# Altium footprint library Package_DFN_QFN.PcbLib: 557 footprints (part 1 of 35)
Each footprint in its own frame and in the unit in brackets; x right, y up, seen from the top. Pads: shape width x height; smd on the part's side, far side on the other; paste and mask are expansions set on the pad; w line width, h text height; cw(c..) or ccw(c..) is an arc to the next point about the centre after c.
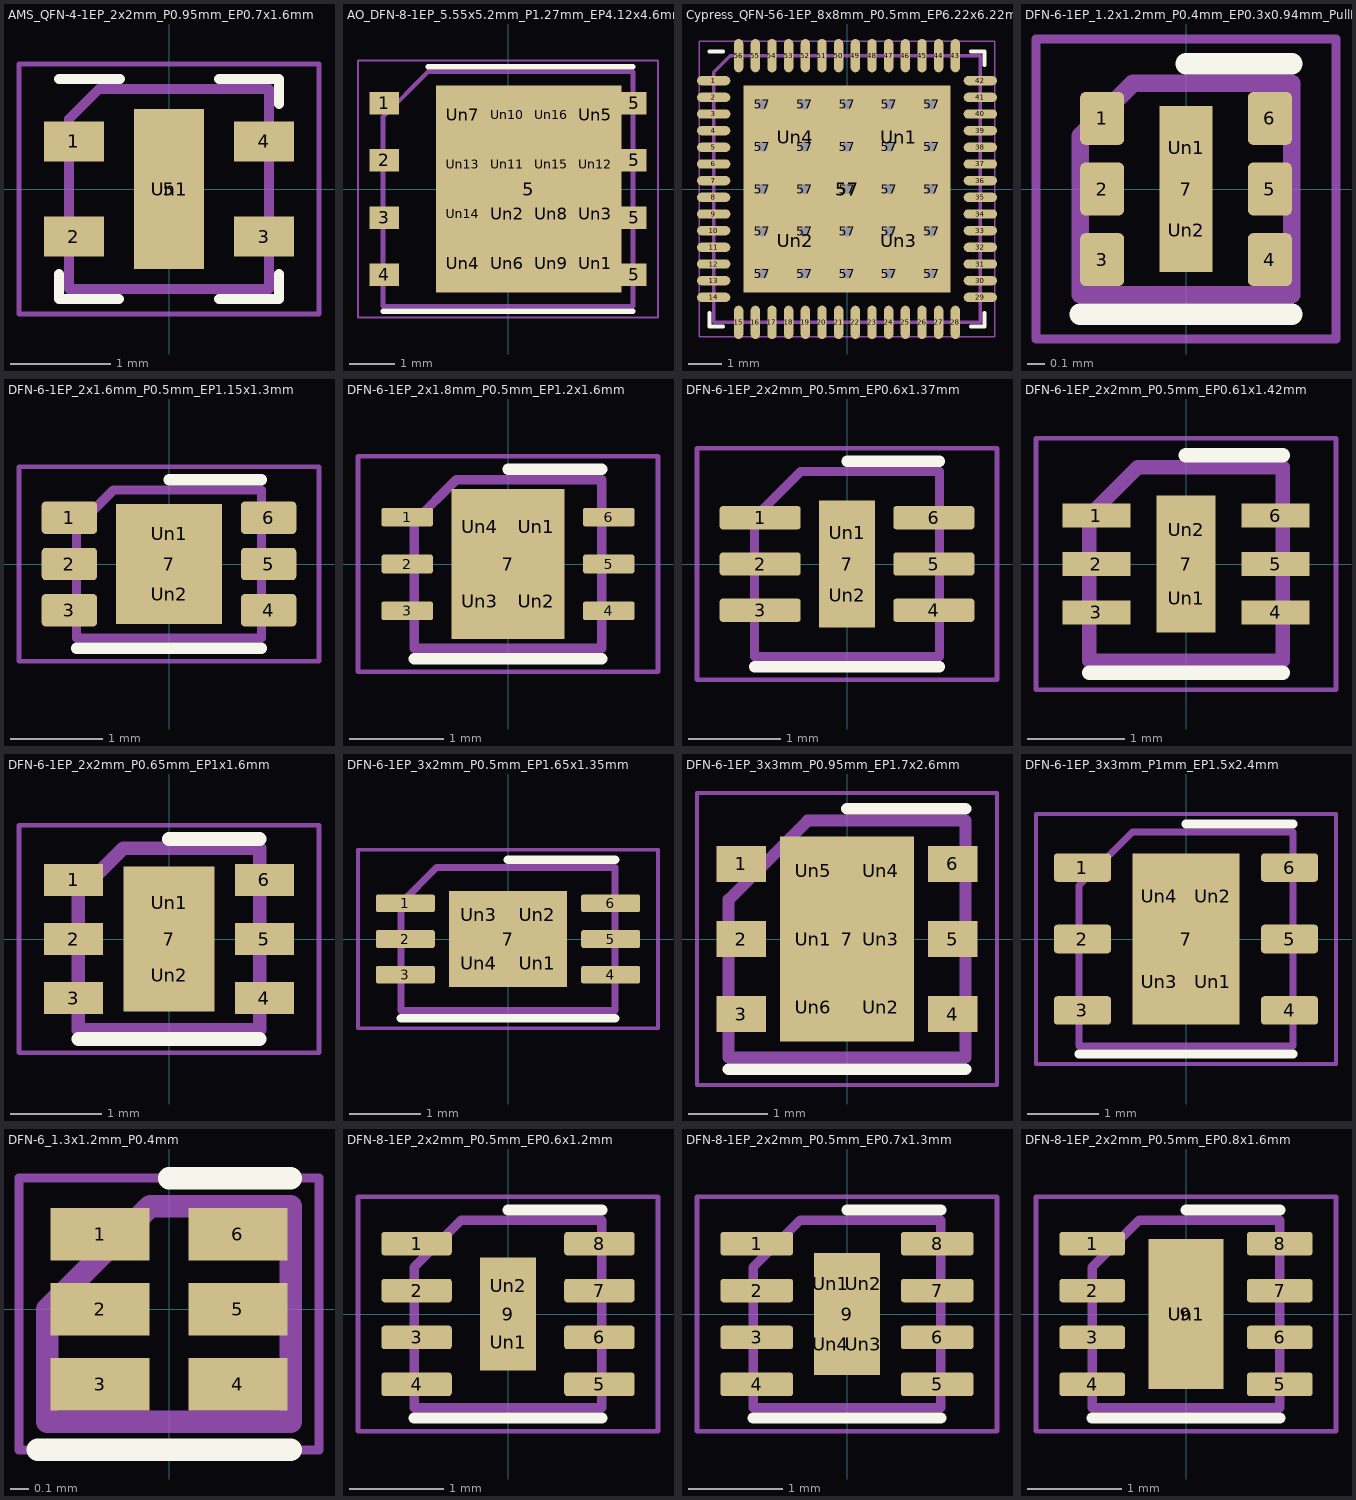
[diagram p0: the footprints below, top view; thin cyan lines are the x and y axes]

## AMS_QFN-4-1EP_2x2mm_P0.95mm_EP0.7x1.6mm [mm]
pads (6):
  rect 0.6x0.4 smd: 1(-0.95,0.475) 2(-0.95,-0.475) 3(0.95,-0.475) 4(0.95,0.475)
  rect 0.7x1.6 smd: 5(0,0)
  rect 0.35x0.8 on Top Paste: Un1(0,0)
F.SilkS:
  lines w0.1: -1.1,-0.85 -1.1,-1.1 -0.5,-1.1 ; -1.1,1.1 -0.49,1.1 ; 0.5,-1.1 1.1,-1.1 1.1,-0.85 ; 0.5,1.1 1.1,1.1 1.1,0.85
F.CrtYd:
  lines w0.05: -1.5,-1.25 -1.5,1.25 1.5,1.25 1.5,-1.25 -1.5,-1.25
F.Fab:
  lines w0.1: -1,-1 1,-1 1,1 -0.7,1 -1,0.7 -1,-1
  text "'.Designator'" at -1.599,-0.316 h0.4

## AO_DFN-8-1EP_5.55x5.2mm_P1.27mm_EP4.12x4.6mm [mm]
pads (25):
  rect 0.65x0.5 smd: 1(-2.75,1.905) 2(-2.75,0.635) 3(-2.75,-0.635) 4(-2.75,-1.905)
  rect 4.12x4.6 smd: 5(0.465,0)
  rect 0.55x0.5 smd: 5(2.8,-1.905) 5(2.8,-0.635) 5(2.8,0.635) 5(2.8,1.905)
  rect 0.78x0.9 on Top Paste: Un1(1.94,-1.65) Un2(-0.02,-0.55) Un3(1.94,-0.55) Un4(-1,-1.65) Un5(1.94,1.65) Un6(-0.02,-1.65) Un7(-1,1.65) Un8(0.96,-0.55) Un9(0.96,-1.65) Un10(-0.02,1.65) Un11(-0.02,0.55) Un12(1.94,0.55) Un13(-1,0.55) Un14(-1,-0.55) Un15(0.96,0.55) Un16(0.96,1.65)
F.SilkS:
  lines w0.12: -2.775,-2.71 2.775,-2.71 ; -1.775,2.71 2.775,2.71
F.CrtYd:
  lines w0.05: -3.33,-2.85 3.33,-2.85 3.33,2.85 -3.33,2.85 -3.33,-2.85
F.Fab:
  lines w0.1: -2.775,-2.6 2.775,-2.6 2.775,2.6 -1.775,2.6 -2.775,1.6 -2.775,-2.6
  text "'.Designator'" at -4.047,-0.84 h1

## Cypress_QFN-56-1EP_8x8mm_P0.5mm_EP6.22x6.22mm_ThermalVias [mm]
pads (87):
  rrect100% 1x0.28 smd: 1(-4,3.25) 2(-4,2.75) 3(-4,2.25) 4(-4,1.75) 5(-4,1.25) 6(-4,0.75) 7(-4,0.25) 8(-4,-0.25) 9(-4,-0.75) 10(-4,-1.25) 11(-4,-1.75) 12(-4,-2.25) 13(-4,-2.75) 14(-4,-3.25) 29(4,-3.25) 30(4,-2.75) 31(4,-2.25) 32(4,-1.75) 33(4,-1.25) 34(4,-0.75) 35(4,-0.25) 36(4,0.25) 37(4,0.75) 38(4,1.25) 39(4,1.75) 40(4,2.25) 41(4,2.75) 42(4,3.25)
  rrect100% 0.28x1 smd: 15(-3.25,-4) 16(-2.75,-4) 17(-2.25,-4) 18(-1.75,-4) 19(-1.25,-4) 20(-0.75,-4) 21(-0.25,-4) 22(0.25,-4) 23(0.75,-4) 24(1.25,-4) 25(1.75,-4) 26(2.25,-4) 27(2.75,-4) 28(3.25,-4) 43(3.25,4) 44(2.75,4) 45(2.25,4) 46(1.75,4) 47(1.25,4) 48(0.75,4) 49(0.25,4) 50(-0.25,4) 51(-0.75,4) 52(-1.25,4) 53(-1.75,4) 54(-2.25,4) 55(-2.75,4) 56(-3.25,4)
  round 0.6 hole 0.3: 57(-2.54,-2.54) 57(-2.54,-1.27) 57(-2.54,0) 57(-2.54,1.27) 57(-2.54,2.54) 57(-1.27,-2.54) 57(-1.27,-1.27) 57(-1.27,0) 57(-1.27,1.27) 57(-1.27,2.54) 57(0,-2.54) 57(0,-1.27) 57(0,0) 57(0,1.27) 57(0,2.54) 57(1.27,-2.54) 57(1.27,-1.27) 57(1.27,0) 57(1.27,1.27) 57(1.27,2.54) 57(2.54,-2.54) 57(2.54,-1.27) 57(2.54,0) 57(2.54,1.27) 57(2.54,2.54)
  rect 6.22x6.22 smd: 57(0,0)
  rect 6.1x6.1 smd far side: 57(0,0)
  rect 2.6x2.6 on Top Paste: Un1(1.555,1.555) Un2(-1.555,-1.555) Un3(1.555,-1.555) Un4(-1.555,1.555)
F.SilkS:
  lines w0.12: -4.12,-3.72 -4.12,-4.12 -3.72,-4.12 ; -4.12,4.12 -3.72,4.12 ; 3.72,-4.12 4.12,-4.12 4.12,-3.72 ; 3.72,4.12 4.12,4.12 4.12,3.72
F.Mask:
  circle w0.2: c1.27,2.54 r0.3
  circle w0.2: c2.54,1.27 r0.3
  circle w0.2: c0,0 r0.3
  circle w0.2: c-1.27,2.54 r0.3
  circle w0.2: c2.54,-1.27 r0.3
  circle w0.2: c-2.54,0 r0.3
  circle w0.2: c2.54,-2.54 r0.3
  circle w0.2: c-2.54,-2.54 r0.3
  circle w0.2: c-1.27,0 r0.3
  circle w0.2: c0,2.54 r0.3
  circle w0.2: c1.27,0 r0.3
  circle w0.2: c-2.54,1.27 r0.3
  circle w0.2: c1.27,1.27 r0.3
  circle w0.2: c-2.54,2.54 r0.3
  circle w0.2: c-2.54,-1.27 r0.3
  circle w0.2: c0,-1.27 r0.3
  circle w0.2: c1.27,-2.54 r0.3
  circle w0.2: c-1.27,-1.27 r0.3
  circle w0.2: c2.54,2.54 r0.3
  circle w0.2: c0,-2.54 r0.3
  circle w0.2: c-1.27,-2.54 r0.3
  circle w0.2: c-1.27,1.27 r0.3
  circle w0.2: c1.27,-1.27 r0.3
  circle w0.2: c0,1.27 r0.3
  circle w0.2: c2.54,0 r0.3
  region: 3.11,-3.11 2.75,-3.11 2.75,3.11 3.11,3.11
  region: 3.11,-3.11 -3.11,-3.11 -3.11,-2.75 3.11,-2.75
  region: -2.75,-3.11 -3.11,-3.11 -3.11,3.11 -2.75,3.11
  region: 3.11,2.75 -3.11,2.75 -3.11,3.11 3.11,3.11
  lines w0.864: -2.54,-1.905 2.54,-1.905 ; -2.54,-0.635 2.54,-0.635 ; -2.54,0.635 2.54,0.635 ; -2.54,1.905 2.54,1.905 ; -1.905,-2.54 -1.905,2.54 ; -0.635,-2.54 -0.635,2.54 ; 0.635,-2.54 0.635,2.54 ; 1.905,-2.54 1.905,2.54
F.CrtYd:
  lines w0.05: -4.43,-4.43 -4.43,4.43 4.43,4.43 4.43,-4.43 -4.43,-4.43
F.Fab:
  lines w0.1: -4,-4 4,-4 4,4 -3.5,4 -4,3.5 -4,-4
  text "'.Designator'" at -4.047,-0.84 h1

## DFN-6-1EP_1.2x1.2mm_P0.4mm_EP0.3x0.94mm_PullBack [mm]
pads (9):
  rrect25% 0.25x0.3 smd: 1(-0.475,0.4) 2(-0.475,0) 3(-0.475,-0.4) 4(0.475,-0.4) 5(0.475,0) 6(0.475,0.4)
  rect 0.3x0.94 smd: 7(0,0)
  rrect25% 0.24x0.38 on Top Paste: Un1(0,0.235) Un2(0,-0.235)
F.SilkS:
  lines w0.12: -0.6,-0.71 0.6,-0.71 ; 0,0.71 0.6,0.71
F.CrtYd:
  lines w0.05: -0.85,-0.85 0.85,-0.85 0.85,0.85 -0.85,0.85 -0.85,-0.85
F.Fab:
  lines w0.1: -0.6,-0.6 -0.6,0.3 -0.3,0.6 0.6,0.6 0.6,-0.6 -0.6,-0.6
  text "'.Designator'" at -1.209,-0.247 h0.3

## DFN-6-1EP_2x1.6mm_P0.5mm_EP1.15x1.3mm [mm]
pads (9):
  rrect25% 0.6x0.35 smd: 1(-1.075,0.5) 2(-1.075,0) 3(-1.075,-0.5) 4(1.075,-0.5) 5(1.075,0) 6(1.075,0.5)
  rect 1.15x1.3 smd: 7(0,0)
  rrect25% 0.93x0.52 on Top Paste: Un1(0,0.325) Un2(0,-0.325)
F.SilkS:
  lines w0.12: -1,-0.91 1,-0.91 ; 0,0.91 1,0.91
F.CrtYd:
  lines w0.05: -1.62,-1.05 -1.62,1.05 1.62,1.05 1.62,-1.05 -1.62,-1.05
F.Fab:
  lines w0.1: -1,-0.8 1,-0.8 1,0.8 -0.6,0.8 -1,0.4 -1,-0.8
  text "'.Designator'" at -2.028,-0.425 h0.5

## DFN-6-1EP_2x1.8mm_P0.5mm_EP1.2x1.6mm [mm]
pads (11):
  rrect25% 0.55x0.2 smd: 1(-1.075,0.5) 2(-1.075,0) 3(-1.075,-0.5) 4(1.075,-0.5) 5(1.075,0) 6(1.075,0.5)
  rect 1.2x1.6 smd: 7(0,0)
  rrect25% 0.48x0.64 on Top Paste: Un1(0.3,0.4) Un2(0.3,-0.4) Un3(-0.3,-0.4) Un4(-0.3,0.4)
F.SilkS:
  lines w0.12: -1,-1.01 1,-1.01 ; 0,1.01 1,1.01
F.CrtYd:
  lines w0.05: -1.6,-1.15 -1.6,1.15 1.6,1.15 1.6,-1.15 -1.6,-1.15
F.Fab:
  lines w0.1: -1,-0.9 1,-0.9 1,0.9 -0.55,0.9 -1,0.45 -1,-0.9
  text "'.Designator'" at -2.028,-0.425 h0.5

## DFN-6-1EP_2x2mm_P0.5mm_EP0.6x1.37mm [mm]
pads (9):
  rrect25% 0.875x0.25 smd: 1(-0.937,0.5) 2(-0.937,0) 3(-0.937,-0.5) 4(0.937,-0.5) 5(0.937,0) 6(0.937,0.5)
  rect 0.6x1.37 smd: 7(0,0)
  rrect25% 0.48x0.55 on Top Paste: Un1(0,0.34) Un2(0,-0.34)
F.SilkS:
  lines w0.12: -1,-1.11 1,-1.11 ; 0,1.11 1,1.11
F.CrtYd:
  lines w0.05: -1.62,-1.25 1.62,-1.25 1.62,1.25 -1.62,1.25 -1.62,-1.25
F.Fab:
  lines w0.1: -1,-1 -1,0.5 -0.5,1 1,1 1,-1 -1,-1
  text "'.Designator'" at -2.028,-0.425 h0.5

## DFN-6-1EP_2x2mm_P0.5mm_EP0.61x1.42mm [mm]
pads (9):
  rect 0.7x0.25 smd: 1(-0.925,0.5) 2(-0.925,0) 3(-0.925,-0.5) 4(0.925,-0.5) 5(0.925,0) 6(0.925,0.5)
  rect 0.61x1.42 smd: 7(0,0)
  rect 0.5x0.56 on Top Paste: Un1(0,-0.355) Un2(0,0.355)
F.SilkS:
  lines w0.15: -1,-1.125 1,-1.125 ; 0,1.125 1,1.125
F.CrtYd:
  lines w0.05: -1.55,-1.3 -1.55,1.3 1.55,1.3 1.55,-1.3 -1.55,-1.3
F.Fab:
  lines w0.15: -1,-1 -1,0.5 -0.5,1 1,1 1,-1 -1,-1
  text "'.Designator'" at -2.023,-0.42 h0.5

## DFN-6-1EP_2x2mm_P0.65mm_EP1x1.6mm [mm]
pads (9):
  rect 0.65x0.35 smd: 1(-1.05,0.65) 2(-1.05,0) 3(-1.05,-0.65) 4(1.05,-0.65) 5(1.05,0) 6(1.05,0.65)
  rect 1x1.6 smd: 7(0,0)
  rect 0.82x0.63 on Top Paste: Un1(0,0.4) Un2(0,-0.4)
F.SilkS:
  lines w0.15: -1,-1.1 1,-1.1 ; 0,1.1 1,1.1
F.CrtYd:
  lines w0.05: -1.65,-1.25 -1.65,1.25 1.65,1.25 1.65,-1.25 -1.65,-1.25
F.Fab:
  lines w0.15: -1,-1 -1,0.5 -0.5,1 1,1 1,-1 -1,-1
  text "'.Designator'" at -2.023,-0.42 h0.5

## DFN-6-1EP_3x2mm_P0.5mm_EP1.65x1.35mm [mm]
pads (11):
  rrect25% 0.825x0.25 smd: 1(-1.438,0.5) 2(-1.438,0) 3(-1.438,-0.5) 4(1.438,-0.5) 5(1.438,0) 6(1.438,0.5)
  rect 1.65x1.35 smd: 7(0,0)
  rrect25% 0.67x0.54 on Top Paste: Un1(0.41,-0.34) Un2(0.41,0.34) Un3(-0.41,0.34) Un4(-0.41,-0.34)
F.SilkS:
  lines w0.12: -1.5,-1.11 1.5,-1.11 ; 0,1.11 1.5,1.11
F.CrtYd:
  lines w0.05: -2.1,-1.25 -2.1,1.25 2.1,1.25 2.1,-1.25 -2.1,-1.25
F.Fab:
  lines w0.1: -1.5,-1 1.5,-1 1.5,1 -1,1 -1.5,0.5 -1.5,-1
  text "'.Designator'" at -3.033,-0.628 h0.75

## DFN-6-1EP_3x3mm_P0.95mm_EP1.7x2.6mm [mm]
pads (13):
  rect 0.63x0.45 smd: 1(-1.34,0.95) 2(-1.34,0) 3(-1.34,-0.95) 4(1.34,-0.95) 5(1.34,0) 6(1.34,0.95)
  rect 1.7x2.6 smd: 7(0,0)
  rect 0.66x0.73 on Top Paste: Un1(-0.425,0) Un2(0.425,-0.866) Un3(0.425,0) Un4(0.425,0.866) Un5(-0.425,0.866) Un6(-0.425,-0.866)
F.SilkS:
  lines w0.15: -1.5,-1.65 1.5,-1.65 ; 0,1.65 1.5,1.65
F.CrtYd:
  lines w0.05: -1.9,-1.85 1.9,-1.85 1.9,1.85 -1.9,1.85 -1.9,-1.85
F.Fab:
  lines w0.15: -1.5,-1.5 1.5,-1.5 1.5,1.5 -0.5,1.5 -1.5,0.5 -1.5,-1.5
  text "'.Designator'" at -2.833,-0.588 h0.7

## DFN-6-1EP_3x3mm_P1mm_EP1.5x2.4mm [mm]
pads (11):
  rrect25% 0.8x0.4 smd: 1(-1.45,1) 2(-1.45,0) 3(-1.45,-1) 4(1.45,-1) 5(1.45,0) 6(1.45,1)
  rect 1.5x2.4 smd: 7(0,0)
  rrect25% 0.6x0.97 on Top Paste: Un1(0.375,-0.6) Un2(0.375,0.6) Un3(-0.375,-0.6) Un4(-0.375,0.6)
F.SilkS:
  lines w0.12: -1.5,-1.61 1.5,-1.61 ; 0,1.61 1.5,1.61
F.CrtYd:
  lines w0.05: -2.1,-1.75 -2.1,1.75 2.1,1.75 2.1,-1.75 -2.1,-1.75
F.Fab:
  lines w0.1: -1.5,-1.5 -1.5,0.75 -0.75,1.5 1.5,1.5 1.5,-1.5 -1.5,-1.5
  text "'.Designator'" at -3.033,-0.628 h0.75

## DFN-6_1.3x1.2mm_P0.4mm [mm]
pads (6):
  rect 0.53x0.28 smd: 1(-0.368,0.4) 2(-0.368,0) 3(-0.368,-0.4) 4(0.368,-0.4) 5(0.368,0) 6(0.368,0.4)
F.SilkS:
  lines w0.12: -0.7,-0.75 0.65,-0.75 ; 0,0.7 0.65,0.7
F.CrtYd:
  lines w0.05: -0.8,-0.75 0.8,-0.75 0.8,0.7 -0.8,0.7 -0.8,-0.75
F.Fab:
  lines w0.12: -0.65,-0.6 -0.65,0 -0.1,0.55 0.65,0.55 0.65,-0.6 -0.65,-0.6
  text "'.Designator'" at -2.023,-0.445 h0.5

## DFN-8-1EP_2x2mm_P0.5mm_EP0.6x1.2mm [mm]
pads (11):
  rrect25% 0.75x0.25 smd: 1(-0.975,0.75) 2(-0.975,0.25) 3(-0.975,-0.25) 4(-0.975,-0.75) 5(0.975,-0.75) 6(0.975,-0.25) 7(0.975,0.25) 8(0.975,0.75)
  rect 0.6x1.2 smd: 9(0,0)
  rrect25% 0.48x0.48 on Top Paste: Un1(0,-0.3) Un2(0,0.3)
F.SilkS:
  lines w0.12: -1,-1.11 1,-1.11 ; 0,1.11 1,1.11
F.CrtYd:
  lines w0.05: -1.6,-1.25 -1.6,1.25 1.6,1.25 1.6,-1.25 -1.6,-1.25
F.Fab:
  lines w0.1: -1,-1 -1,0.5 -0.5,1 1,1 1,-1 -1,-1
  text "'.Designator'" at -2.028,-0.425 h0.5

## DFN-8-1EP_2x2mm_P0.5mm_EP0.7x1.3mm [mm]
pads (13):
  rrect25% 0.775x0.25 smd: 1(-0.962,0.75) 2(-0.962,0.25) 3(-0.962,-0.25) 4(-0.962,-0.75) 5(0.962,-0.75) 6(0.962,-0.25) 7(0.962,0.25) 8(0.962,0.75)
  rect 0.7x1.3 smd: 9(0,0)
  rrect25% 0.28x0.52 on Top Paste: Un1(-0.175,0.325) Un2(0.175,0.325) Un3(0.175,-0.325) Un4(-0.175,-0.325)
F.SilkS:
  lines w0.12: -1,-1.11 1,-1.11 ; 0,1.11 1,1.11
F.CrtYd:
  lines w0.05: -1.6,-1.25 -1.6,1.25 1.6,1.25 1.6,-1.25 -1.6,-1.25
F.Fab:
  lines w0.1: -1,-1 1,-1 1,1 -0.5,1 -1,0.5 -1,-1
  text "'.Designator'" at -2.028,-0.425 h0.5

## DFN-8-1EP_2x2mm_P0.5mm_EP0.8x1.6mm [mm]
pads (10):
  rrect25% 0.7x0.25 smd: 1(-1,0.75) 2(-1,0.25) 3(-1,-0.25) 4(-1,-0.75) 5(1,-0.75) 6(1,-0.25) 7(1,0.25) 8(1,0.75)
  rect 0.8x1.6 smd: 9(0,0)
  rrect25% 0.64x1.29 on Top Paste: Un1(0,0)
F.SilkS:
  lines w0.12: -1,-1.11 1,-1.11 ; 0,1.11 1,1.11
F.CrtYd:
  lines w0.05: -1.6,-1.25 1.6,-1.25 1.6,1.25 -1.6,1.25 -1.6,-1.25
F.Fab:
  lines w0.1: -1,-1 -1,0.5 -0.5,1 1,1 1,-1 -1,-1
  text "'.Designator'" at -2.028,-0.425 h0.5